# Altium footprint library Package_SO.PcbLib: 333 footprints (part 4 of 21)
Each footprint in its own frame and in the unit in brackets; x right, y up, seen from the top. Pads: shape width x height; smd on the part's side, far side on the other; paste and mask are expansions set on the pad; w line width, h text height; cw(c..) or ccw(c..) is an arc to the next point about the centre after c.
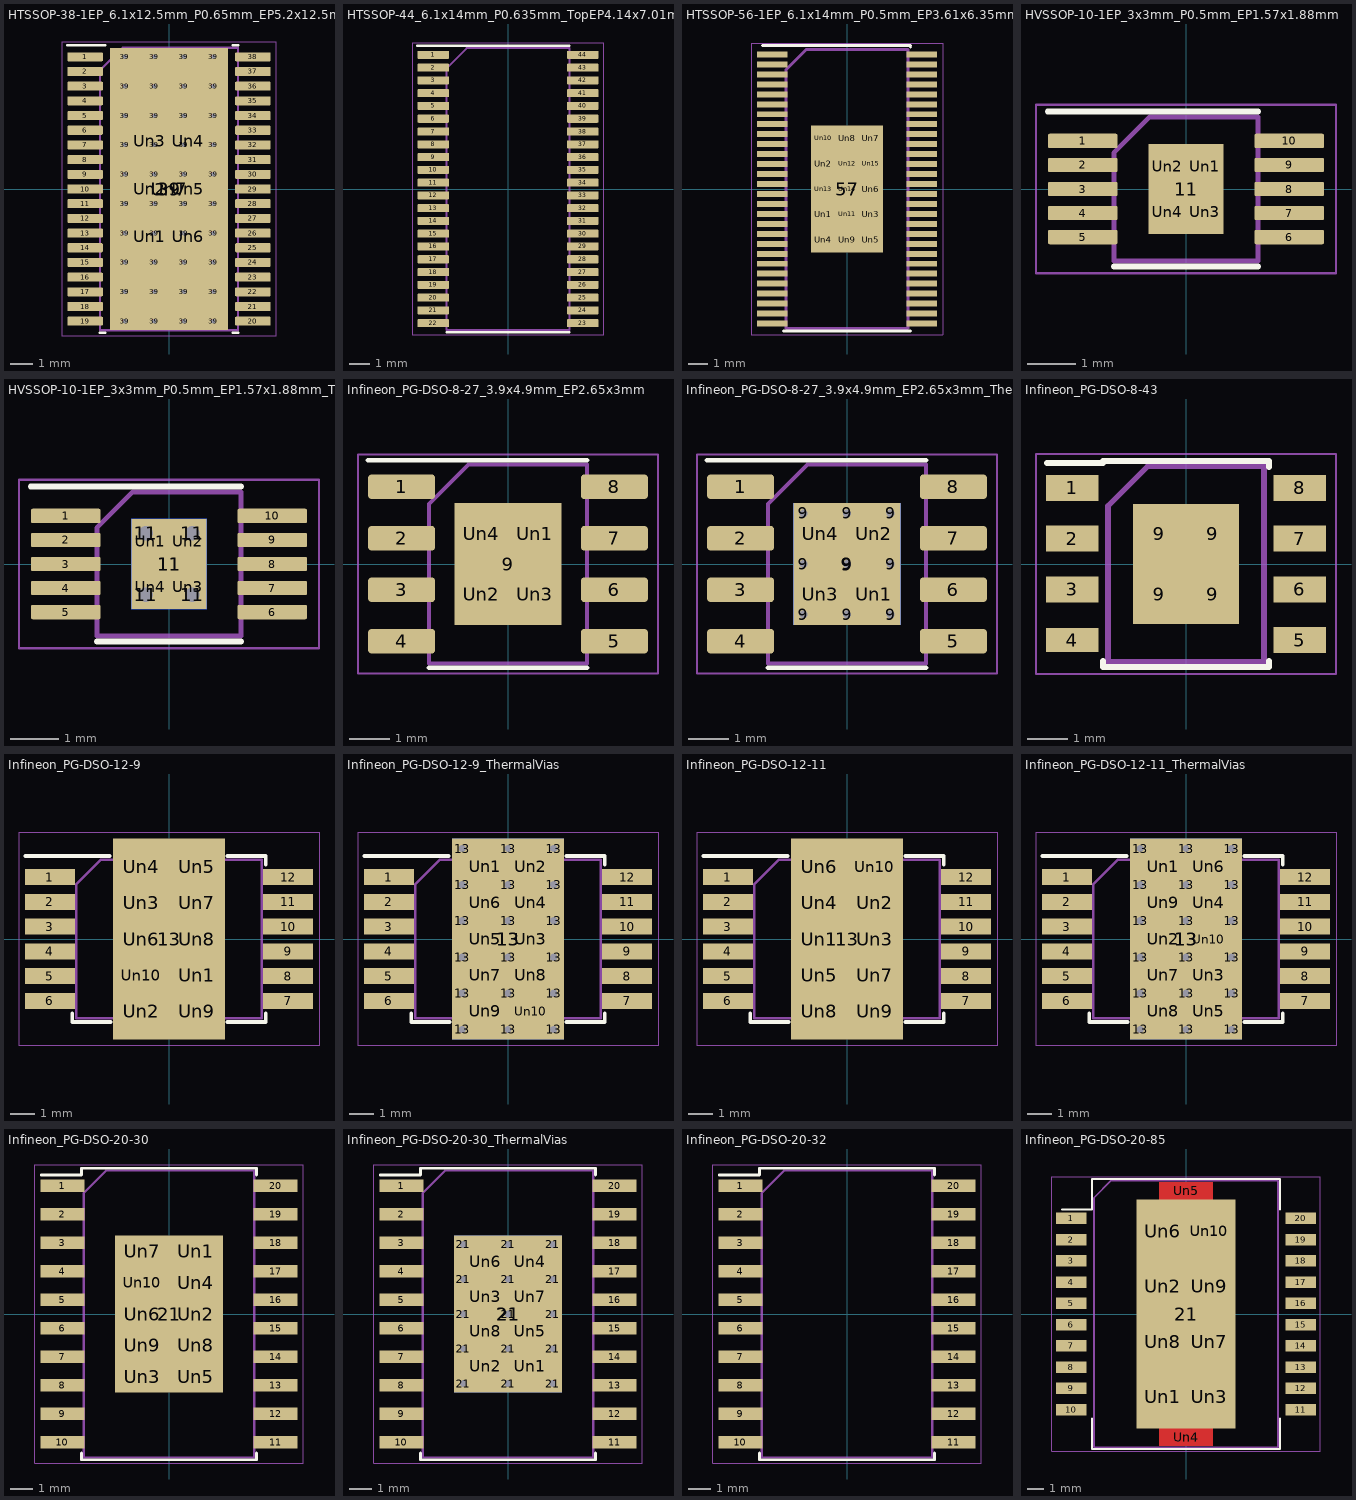
[diagram p3: the footprints below, top view; thin cyan lines are the x and y axes]

## HTSSOP-38-1EP_6.1x12.5mm_P0.65mm_EP5.2x12.5mm_Mask3.39x6.35mm_ThermalVias [mm]
pads (87):
  rrect25% 1.575x0.4 smd: 1(-3.712,5.85) 2(-3.712,5.2) 3(-3.712,4.55) 4(-3.712,3.9) 5(-3.712,3.25) 6(-3.712,2.6) 7(-3.712,1.95) 8(-3.712,1.3) 9(-3.712,0.65) 10(-3.712,0) 11(-3.712,-0.65) 12(-3.712,-1.3) 13(-3.712,-1.95) 14(-3.712,-2.6) 15(-3.712,-3.25) 16(-3.712,-3.9) 17(-3.712,-4.55) 18(-3.712,-5.2) 19(-3.712,-5.85) 20(3.712,-5.85) 21(3.712,-5.2) 22(3.712,-4.55) 23(3.712,-3.9) 24(3.712,-3.25) 25(3.712,-2.6) 26(3.712,-1.95) 27(3.712,-1.3) 28(3.712,-0.65) 29(3.712,0) 30(3.712,0.65) 31(3.712,1.3) 32(3.712,1.95) 33(3.712,2.6) 34(3.712,3.25) 35(3.712,3.9) 36(3.712,4.55) 37(3.712,5.2) 38(3.712,5.85)
  round 0.5 hole 0.2: 39(-1.95,-5.85) 39(-1.95,-4.55) 39(-1.95,-3.25) 39(-1.95,-1.95) 39(-1.95,-0.65) 39(-1.95,0.65) 39(-1.95,1.95) 39(-1.95,3.25) 39(-1.95,4.55) 39(-1.95,5.85) 39(-0.65,-5.85) 39(-0.65,-4.55) 39(-0.65,-3.25) 39(-0.65,-1.95) 39(-0.65,-0.65) 39(-0.65,0.65) 39(-0.65,1.95) 39(-0.65,3.25) 39(-0.65,4.55) 39(-0.65,5.85) 39(0.65,-5.85) 39(0.65,-4.55) 39(0.65,-3.25) 39(0.65,-1.95) 39(0.65,-0.65) 39(0.65,0.65) 39(0.65,1.95) 39(0.65,3.25) 39(0.65,4.55) 39(0.65,5.85) 39(1.95,-5.85) 39(1.95,-4.55) 39(1.95,-3.25) 39(1.95,-1.95) 39(1.95,-0.65) 39(1.95,0.65) 39(1.95,1.95) 39(1.95,3.25) 39(1.95,4.55) 39(1.95,5.85)
  rect 5.2x12.5 smd: 39(0,0)
  rect 4.4x12.2 smd far side: 39(0,0)
  rrect18% 1.37x1.71 on Top Paste: Un1(-0.85,-2.12) Un2(-0.85,0) Un3(-0.85,2.12) Un4(0.85,2.12) Un5(0.85,0) Un6(0.85,-2.12)
  rect 3.39x6.35 on Top Solder: Un7(0,0)
F.SilkS:
  lines w0.12: -4.5,6.36 -2.836,6.36 ; -3.05,-6.36 -2.836,-6.36 ; 2.836,-6.36 3.05,-6.36 ; 2.836,6.36 3.05,6.36
F.CrtYd:
  lines w0.05: -4.75,-6.5 -4.75,6.5 4.75,6.5 4.75,-6.5 -4.75,-6.5
F.Fab:
  lines w0.1: -3.05,-6.25 3.05,-6.25 3.05,6.25 -2.05,6.25 -3.05,5.25 -3.05,-6.25
  text "'.Designator'" at -4.047,-0.84 h1

## HTSSOP-44_6.1x14mm_P0.635mm_TopEP4.14x7.01mm [mm]
pads (44):
  rrect25% 1.575x0.4 smd: 1(-3.712,6.667) 2(-3.712,6.032) 3(-3.712,5.397) 4(-3.712,4.763) 5(-3.712,4.127) 6(-3.712,3.492) 7(-3.712,2.857) 8(-3.712,2.222) 9(-3.712,1.587) 10(-3.712,0.953) 11(-3.712,0.318) 12(-3.712,-0.318) 13(-3.712,-0.953) 14(-3.712,-1.587) 15(-3.712,-2.222) 16(-3.712,-2.857) 17(-3.712,-3.492) 18(-3.712,-4.127) 19(-3.712,-4.763) 20(-3.712,-5.397) 21(-3.712,-6.032) 22(-3.712,-6.667) 23(3.712,-6.667) 24(3.712,-6.032) 25(3.712,-5.397) 26(3.712,-4.763) 27(3.712,-4.127) 28(3.712,-3.492) 29(3.712,-2.857) 30(3.712,-2.222) 31(3.712,-1.587) 32(3.712,-0.953) 33(3.712,-0.318) 34(3.712,0.318) 35(3.712,0.953) 36(3.712,1.587) 37(3.712,2.222) 38(3.712,2.857) 39(3.712,3.492) 40(3.712,4.127) 41(3.712,4.763) 42(3.712,5.397) 43(3.712,6.032) 44(3.712,6.667)
F.SilkS:
  lines w0.12: -4.5,7.127 0,7.127 3.05,7.127 ; -3.05,-7.127 0,-7.127 3.05,-7.127
F.CrtYd:
  lines w0.05: -4.75,-7.25 -4.75,7.25 4.75,7.25 4.75,-7.25 -4.75,-7.25
F.Fab:
  lines w0.1: -3.05,-7 -3.05,6 -2.05,7 3.05,7 3.05,-7 -3.05,-7
  text "'.Designator'" at -4.047,-0.84 h1

## HTSSOP-56-1EP_6.1x14mm_P0.5mm_EP3.61x6.35mm [mm]
pads (72):
  rect 1.55x0.3 smd: 1(-3.75,6.75) 2(-3.75,6.25) 3(-3.75,5.75) 4(-3.75,5.25) 5(-3.75,4.75) 6(-3.75,4.25) 7(-3.75,3.75) 8(-3.75,3.25) 9(-3.75,2.75) 10(-3.75,2.25) 11(-3.75,1.75) 12(-3.75,1.25) 13(-3.75,0.75) 14(-3.75,0.25) 15(-3.75,-0.25) 16(-3.75,-0.75) 17(-3.75,-1.25) 18(-3.75,-1.75) 19(-3.75,-2.25) 20(-3.75,-2.75) 21(-3.75,-3.25) 22(-3.75,-3.75) 23(-3.75,-4.25) 24(-3.75,-4.75) 25(-3.75,-5.25) 26(-3.75,-5.75) 27(-3.75,-6.25) 28(-3.75,-6.75) 29(3.75,-6.75) 30(3.75,-6.25) 31(3.75,-5.75) 32(3.75,-5.25) 33(3.75,-4.75) 34(3.75,-4.25) 35(3.75,-3.75) 36(3.75,-3.25) 37(3.75,-2.75) 38(3.75,-2.25) 39(3.75,-1.75) 40(3.75,-1.25) 41(3.75,-0.75) 42(3.75,-0.25) 43(3.75,0.25) 44(3.75,0.75) 45(3.75,1.25) 46(3.75,1.75) 47(3.75,2.25) 48(3.75,2.75) 49(3.75,3.25) 50(3.75,3.75) 51(3.75,4.25) 52(3.75,4.75) 53(3.75,5.25) 54(3.75,5.75) 55(3.75,6.25) 56(3.75,6.75)
  rect 3.61x6.35 smd: 57(0,0)
  rect 0.96x1.03 on Top Paste: Un1(-1.203,-1.27) Un2(-1.203,1.27) Un3(1.203,-1.27) Un4(-1.203,-2.54) Un5(1.203,-2.54) Un6(1.203,0) Un7(1.203,2.54) Un8(0,2.54) Un9(0,-2.54) Un10(-1.203,2.54) Un11(0,-1.27) Un12(0,1.27) Un13(-1.203,0) Un14(0,0) Un15(1.203,1.27)
F.SilkS:
  lines w0.15: -4.25,7.2 3.175,7.2 ; -3.175,-7.117 -3.175,-7.125 3.175,-7.125 3.175,-7.117 ; 3.175,7.117 3.175,7.125
F.CrtYd:
  lines w0.05: -4.8,-7.3 4.8,-7.3 4.8,7.3 -4.8,7.3 -4.8,-7.3
F.Fab:
  lines w0.15: -3.05,-7 -3.05,6 -2.05,7 3.05,7 3.05,-7 -3.05,-7
  text "'.Designator'" at -4.047,-0.84 h1

## HVSSOP-10-1EP_3x3mm_P0.5mm_EP1.57x1.88mm [mm]
pads (15):
  rrect25% 1.45x0.3 smd: 1(-2.15,1) 2(-2.15,0.5) 3(-2.15,0) 4(-2.15,-0.5) 5(-2.15,-1) 6(2.15,-1) 7(2.15,-0.5) 8(2.15,0) 9(2.15,0.5) 10(2.15,1)
  rect 1.57x1.88 smd: 11(0,0)
  rrect25% 0.63x0.76 on Top Paste: Un1(0.39,0.47) Un2(-0.39,0.47) Un3(0.39,-0.47) Un4(-0.39,-0.47)
F.SilkS:
  lines w0.12: -2.875,1.61 0,1.61 1.5,1.61 ; -1.5,-1.61 0,-1.61 1.5,-1.61
F.CrtYd:
  lines w0.05: -3.12,-1.75 -3.12,1.75 3.12,1.75 3.12,-1.75 -3.12,-1.75
F.Fab:
  lines w0.1: -1.5,-1.5 -1.5,0.75 -0.75,1.5 1.5,1.5 1.5,-1.5 -1.5,-1.5
  text "'.Designator'" at -3.033,-0.628 h0.75

## HVSSOP-10-1EP_3x3mm_P0.5mm_EP1.57x1.88mm_ThermalVias [mm]
pads (20):
  rrect25% 1.45x0.3 smd: 1(-2.15,1) 2(-2.15,0.5) 3(-2.15,0) 4(-2.15,-0.5) 5(-2.15,-1) 6(2.15,-1) 7(2.15,-0.5) 8(2.15,0) 9(2.15,0.5) 10(2.15,1)
  round 0.6 hole 0.3: 11(-0.485,-0.64) 11(-0.485,0.64) 11(0.485,-0.64) 11(0.485,0.64)
  rect 1.57x1.88 smd: 11(0,0)
  rect 1.57x1.88 smd far side: 11(0,0)
  rrect25% 0.63x0.76 on Top Paste: Un1(-0.39,0.47) Un2(0.39,0.47) Un3(0.39,-0.47) Un4(-0.39,-0.47)
F.SilkS:
  lines w0.12: -2.875,1.61 0,1.61 1.5,1.61 ; -1.5,-1.61 0,-1.61 1.5,-1.61
F.CrtYd:
  lines w0.05: -3.12,-1.75 3.12,-1.75 3.12,1.75 -3.12,1.75 -3.12,-1.75
F.Fab:
  lines w0.1: -1.5,-1.5 1.5,-1.5 1.5,1.5 -0.75,1.5 -1.5,0.75 -1.5,-1.5
  text "'.Designator'" at -3.033,-0.628 h0.75

## Infineon_PG-DSO-8-27_3.9x4.9mm_EP2.65x3mm [mm]
pads (13):
  rrect25% 1.65x0.6 smd: 1(-2.625,1.905) 2(-2.625,0.635) 3(-2.625,-0.635) 4(-2.625,-1.905) 5(2.625,-1.905) 6(2.625,-0.635) 7(2.625,0.635) 8(2.625,1.905)
  rect 2.65x3 smd: 9(0,0)
  rrect23% 1.07x1.21 on Top Paste: Un1(0.66,0.75) Un2(-0.66,-0.75) Un3(0.66,-0.75) Un4(-0.66,0.75)
F.SilkS:
  lines w0.12: -3.45,2.56 0,2.56 1.95,2.56 ; -1.95,-2.56 0,-2.56 1.95,-2.56
F.CrtYd:
  lines w0.05: -3.7,-2.7 -3.7,2.7 3.7,2.7 3.7,-2.7 -3.7,-2.7
F.Fab:
  lines w0.1: -1.95,-2.45 -1.95,1.475 -0.975,2.45 1.95,2.45 1.95,-2.45 -1.95,-2.45
  text "'.Designator'" at -3.969,-0.827 h0.98

## Infineon_PG-DSO-8-27_3.9x4.9mm_EP2.65x3mm_ThermalVias [mm]
pads (23):
  rrect25% 1.65x0.6 smd: 1(-2.625,1.905) 2(-2.625,0.635) 3(-2.625,-0.635) 4(-2.625,-1.905) 5(2.625,-1.905) 6(2.625,-0.635) 7(2.625,0.635) 8(2.625,1.905)
  round 0.5 hole 0.2: 9(-1.075,-1.25) 9(-1.075,0) 9(-1.075,1.25) 9(0,-1.25) 9(0,0) 9(0,1.25) 9(1.075,-1.25) 9(1.075,0) 9(1.075,1.25)
  rect 2.65x3 smd: 9(0,0)
  rect 2.65x3 smd far side: 9(0,0)
  rrect23% 1.11x1.25 on Top Paste: Un1(0.66,-0.75) Un2(0.66,0.75) Un3(-0.66,-0.75) Un4(-0.66,0.75)
F.SilkS:
  lines w0.12: -3.45,2.56 0,2.56 1.95,2.56 ; -1.95,-2.56 0,-2.56 1.95,-2.56
F.CrtYd:
  lines w0.05: -3.7,-2.7 -3.7,2.7 3.7,2.7 3.7,-2.7 -3.7,-2.7
F.Fab:
  lines w0.1: -1.95,-2.45 -1.95,1.475 -0.975,2.45 1.95,2.45 1.95,-2.45 -1.95,-2.45
  text "'.Designator'" at -3.969,-0.827 h0.98

## Infineon_PG-DSO-8-43 [mm]
pads (12):
  rect 1.31x0.65 smd: 1(-2.845,1.905) 2(-2.845,0.635) 3(-2.845,-0.635) 5(2.845,-1.905) 6(2.845,-0.635) 7(2.845,0.635) 8(2.845,1.905)
  rect 1.31x0.6 smd: 4(-2.845,-1.905)
  rect 1.325x1.5 smd: 9(-0.663,-0.75) 9(-0.663,0.75) 9(0.663,-0.75) 9(0.663,0.75)
F.SilkS:
  lines w0.15: -3.475,2.525 -2.075,2.525 -2.075,2.575 2.075,2.575 2.075,2.43 ; -2.075,-2.43 -2.075,-2.575 2.075,-2.575 2.075,-2.43
F.CrtYd:
  lines w0.05: -3.75,-2.75 -3.75,2.75 3.75,2.75 3.75,-2.75 -3.75,-2.75
F.Fab:
  lines w0.15: -1.95,-2.45 -1.95,1.45 -0.95,2.45 1.95,2.45 1.95,-2.45 -1.95,-2.45
  text "'.Designator'" at -3.642,-0.756 h0.9

## Infineon_PG-DSO-12-9 [mm]
pads (23):
  rect 2x0.65 smd: 1(-4.8,2.5) 2(-4.8,1.5) 3(-4.8,0.5) 4(-4.8,-0.5) 5(-4.8,-1.5) 6(-4.8,-2.5) 7(4.8,-2.5) 8(4.8,-1.5) 9(4.8,-0.5) 10(4.8,0.5) 11(4.8,1.5) 12(4.8,2.5)
  rect 4.5x8.1 smd: 13(0,0)
  rect 1.95x1.16 on Top Paste: Un1(1.125,-1.46) Un2(-1.125,-2.92) Un3(-1.125,1.46) Un4(-1.125,2.92) Un5(1.125,2.92) Un6(-1.125,0) Un7(1.125,1.46) Un8(1.125,0) Un9(1.125,-2.92) Un10(-1.125,-1.46)
F.SilkS:
  lines w0.15: -5.8,3.35 -2.4,3.35 ; -3.9,-3 -3.9,-3.35 -2.35,-3.35 ; 2.35,-3.35 3.9,-3.35 3.9,-3 ; 2.35,3.35 3.9,3.35 3.9,3
F.CrtYd:
  lines w0.05: -6.05,-4.3 -6.05,4.3 6.05,4.3 6.05,-4.3 -6.05,-4.3
F.Fab:
  lines w0.1: -3.75,-3.2 -3.75,2.2 -2.75,3.2 -0.9,3.2 -0.9,3.9 0.9,3.9 0.9,3.2 3.75,3.2 3.75,-3.2 0.9,-3.2 0.9,-3.9 -0.9,-3.9 -0.9,-3.2 -3.75,-3.2
  text "'.Designator'" at -4.047,-0.84 h1

## Infineon_PG-DSO-12-9_ThermalVias [mm]
pads (42):
  rect 2x0.65 smd: 1(-4.8,2.5) 2(-4.8,1.5) 3(-4.8,0.5) 4(-4.8,-0.5) 5(-4.8,-1.5) 6(-4.8,-2.5) 7(4.8,-2.5) 8(4.8,-1.5) 9(4.8,-0.5) 10(4.8,0.5) 11(4.8,1.5) 12(4.8,2.5)
  round 0.8 hole 0.3: 13(-1.85,-3.65) 13(-1.85,-2.19) 13(-1.85,-0.73) 13(-1.85,0.73) 13(-1.85,2.19) 13(-1.85,3.65) 13(0,-3.65) 13(0,-2.19) 13(0,-0.73) 13(0,0.73) 13(0,2.19) 13(0,3.65) 13(1.85,-3.65) 13(1.85,-2.19) 13(1.85,-0.73) 13(1.85,0.73) 13(1.85,2.19) 13(1.85,3.65)
  rect 4.5x8.1 smd: 13(0,0)
  rect 4.5x8.1 smd far side: 13(0,0)
  rect 1.55x1.16 on Top Paste: Un1(-0.925,2.92) Un2(0.925,2.92) Un3(0.925,0) Un4(0.925,1.46) Un5(-0.925,0) Un6(-0.925,1.46) Un7(-0.925,-1.46) Un8(0.925,-1.46) Un9(-0.925,-2.92) Un10(0.925,-2.92)
F.SilkS:
  lines w0.15: -5.8,3.35 -2.4,3.35 ; -3.9,-3 -3.9,-3.35 -2.35,-3.35 ; 2.35,-3.35 3.9,-3.35 3.9,-3 ; 2.35,3.35 3.9,3.35 3.9,3
F.CrtYd:
  lines w0.05: -6.05,-4.3 -6.05,4.3 6.05,4.3 6.05,-4.3 -6.05,-4.3
F.Fab:
  lines w0.1: -3.75,-3.2 -0.9,-3.2 -0.9,-3.9 0.9,-3.9 0.9,-3.2 3.75,-3.2 3.75,3.2 0.9,3.2 0.9,3.9 -0.9,3.9 -0.9,3.2 -2.75,3.2 -3.75,2.2 -3.75,-3.2
  text "'.Designator'" at -4.047,-0.84 h1

## Infineon_PG-DSO-12-11 [mm]
pads (23):
  rect 2x0.65 smd: 1(-4.8,2.5) 2(-4.8,1.5) 3(-4.8,0.5) 4(-4.8,-0.5) 5(-4.8,-1.5) 6(-4.8,-2.5) 7(4.8,-2.5) 8(4.8,-1.5) 9(4.8,-0.5) 10(4.8,0.5) 11(4.8,1.5) 12(4.8,2.5)
  rect 4.5x8.1 smd: 13(0,0)
  rect 1.95x1.16 on Top Paste: Un1(-1.125,0) Un2(1.125,1.46) Un3(1.125,0) Un4(-1.125,1.46) Un5(-1.125,-1.46) Un6(-1.125,2.92) Un7(1.125,-1.46) Un8(-1.125,-2.92) Un9(1.125,-2.92) Un10(1.125,2.92)
F.SilkS:
  lines w0.15: -5.8,3.35 -2.4,3.35 ; -3.9,-3 -3.9,-3.35 -2.35,-3.35 ; 2.35,-3.35 3.9,-3.35 3.9,-3 ; 2.35,3.35 3.9,3.35 3.9,3
F.CrtYd:
  lines w0.05: -6.05,-4.3 6.05,-4.3 6.05,4.3 -6.05,4.3 -6.05,-4.3
F.Fab:
  lines w0.1: -3.75,-3.2 -3.75,2.2 -2.75,3.2 -0.9,3.2 -0.9,3.9 0.9,3.9 0.9,3.2 3.75,3.2 3.75,-3.2 0.9,-3.2 0.9,-3.9 -0.9,-3.9 -0.9,-3.2 -3.75,-3.2
  text "'.Designator'" at -4.047,-0.84 h1

## Infineon_PG-DSO-12-11_ThermalVias [mm]
pads (42):
  rect 2x0.65 smd: 1(-4.8,2.5) 2(-4.8,1.5) 3(-4.8,0.5) 4(-4.8,-0.5) 5(-4.8,-1.5) 6(-4.8,-2.5) 7(4.8,-2.5) 8(4.8,-1.5) 9(4.8,-0.5) 10(4.8,0.5) 11(4.8,1.5) 12(4.8,2.5)
  round 0.8 hole 0.3: 13(-1.85,-3.65) 13(-1.85,-2.19) 13(-1.85,-0.73) 13(-1.85,0.73) 13(-1.85,2.19) 13(-1.85,3.65) 13(0,-3.65) 13(0,-2.19) 13(0,-0.73) 13(0,0.73) 13(0,2.19) 13(0,3.65) 13(1.85,-3.65) 13(1.85,-2.19) 13(1.85,-0.73) 13(1.85,0.73) 13(1.85,2.19) 13(1.85,3.65)
  rect 4.5x8.1 smd: 13(0,0)
  rect 4.5x8.1 smd far side: 13(0,0)
  rect 1.55x1.16 on Top Paste: Un1(-0.925,2.92) Un2(-0.925,0) Un3(0.925,-1.46) Un4(0.925,1.46) Un5(0.925,-2.92) Un6(0.925,2.92) Un7(-0.925,-1.46) Un8(-0.925,-2.92) Un9(-0.925,1.46) Un10(0.925,0)
F.SilkS:
  lines w0.15: -5.8,3.35 -2.4,3.35 ; -3.9,-3 -3.9,-3.35 -2.35,-3.35 ; 2.35,-3.35 3.9,-3.35 3.9,-3 ; 2.35,3.35 3.9,3.35 3.9,3
F.CrtYd:
  lines w0.05: -6.05,-4.3 -6.05,4.3 6.05,4.3 6.05,-4.3 -6.05,-4.3
F.Fab:
  lines w0.1: -3.75,-3.2 -0.9,-3.2 -0.9,-3.9 0.9,-3.9 0.9,-3.2 3.75,-3.2 3.75,3.2 0.9,3.2 0.9,3.9 -0.9,3.9 -0.9,3.2 -2.75,3.2 -3.75,2.2 -3.75,-3.2
  text "'.Designator'" at -4.047,-0.84 h1

## Infineon_PG-DSO-20-30 [mm]
pads (31):
  rect 1.95x0.55 smd: 1(-4.75,5.715) 2(-4.75,4.445) 3(-4.75,3.175) 4(-4.75,1.905) 5(-4.75,0.635) 6(-4.75,-0.635) 7(-4.75,-1.905) 8(-4.75,-3.175) 9(-4.75,-4.445) 10(-4.75,-5.715) 11(4.75,-5.715) 12(4.75,-4.445) 13(4.75,-3.175) 14(4.75,-1.905) 15(4.75,-0.635) 16(4.75,0.635) 17(4.75,1.905) 18(4.75,3.175) 19(4.75,4.445) 20(4.75,5.715)
  rect 4.8x7 smd: 21(0,0)
  rect 2.1x1.1 on Top Paste: Un1(1.2,2.8) Un2(1.2,0) Un3(-1.2,-2.8) Un4(1.2,1.4) Un5(1.2,-2.8) Un6(-1.2,0) Un7(-1.2,2.8) Un8(1.2,-1.4) Un9(-1.2,-1.4) Un10(-1.2,1.4)
F.SilkS:
  lines w0.12: -5.7,6.2 -3.9,6.2 -3.9,6.5 3.9,6.5 3.9,6.2 ; -3.9,-6.2 -3.9,-6.5 3.9,-6.5 3.9,-6.2
F.CrtYd:
  lines w0.05: -5.98,-6.65 5.98,-6.65 5.98,6.65 -5.98,6.65 -5.98,-6.65
F.Fab:
  lines w0.1: -3.8,-6.4 3.8,-6.4 3.8,6.4 -2.8,6.4 -3.8,5.4 -3.8,-6.4
  text "'.Designator'" at -4.047,-0.84 h1

## Infineon_PG-DSO-20-30_ThermalVias [mm]
pads (45):
  rect 1.95x0.55 smd: 1(-4.75,5.715) 2(-4.75,4.445) 3(-4.75,3.175) 4(-4.75,1.905) 5(-4.75,0.635) 6(-4.75,-0.635) 7(-4.75,-1.905) 8(-4.75,-3.175) 9(-4.75,-4.445) 10(-4.75,-5.715) 11(4.75,-5.715) 12(4.75,-4.445) 13(4.75,-3.175) 14(4.75,-1.905) 15(4.75,-0.635) 16(4.75,0.635) 17(4.75,1.905) 18(4.75,3.175) 19(4.75,4.445) 20(4.75,5.715)
  round 0.8 hole 0.3: 21(-2,-3.1) 21(-2,-1.55) 21(-2,0) 21(-2,1.55) 21(-2,3.1) 21(0,-3.1) 21(0,-1.55) 21(0,0) 21(0,1.55) 21(0,3.1) 21(2,-3.1) 21(2,-1.55) 21(2,0) 21(2,1.55) 21(2,3.1)
  rect 4.8x7 smd far side: 21(0,0)
  rect 4.8x7 smd: 21(0,0)
  rect 1.7x1.25 on Top Paste: Un1(1,-2.325) Un2(-1,-2.325) Un3(-1,0.775) Un4(1,2.325) Un5(1,-0.775) Un6(-1,2.325) Un7(1,0.775) Un8(-1,-0.775)
F.SilkS:
  lines w0.12: -5.7,6.2 -3.9,6.2 -3.9,6.5 3.9,6.5 3.9,6.2 ; -3.9,-6.2 -3.9,-6.5 3.9,-6.5 3.9,-6.2
F.CrtYd:
  lines w0.05: -5.98,-6.65 -5.98,6.65 5.98,6.65 5.98,-6.65 -5.98,-6.65
F.Fab:
  lines w0.1: -3.8,-6.4 3.8,-6.4 3.8,6.4 -2.8,6.4 -3.8,5.4 -3.8,-6.4
  text "'.Designator'" at -4.047,-0.84 h1

## Infineon_PG-DSO-20-32 [mm]
pads (20):
  rect 1.95x0.55 smd: 1(-4.75,5.715) 2(-4.75,4.445) 3(-4.75,3.175) 4(-4.75,1.905) 5(-4.75,0.635) 6(-4.75,-0.635) 7(-4.75,-1.905) 8(-4.75,-3.175) 9(-4.75,-4.445) 10(-4.75,-5.715) 11(4.75,-5.715) 12(4.75,-4.445) 13(4.75,-3.175) 14(4.75,-1.905) 15(4.75,-0.635) 16(4.75,0.635) 17(4.75,1.905) 18(4.75,3.175) 19(4.75,4.445) 20(4.75,5.715)
F.SilkS:
  lines w0.12: -5.7,6.2 -3.9,6.2 -3.9,6.5 3.9,6.5 3.9,6.2 ; -3.9,-6.2 -3.9,-6.5 3.9,-6.5 3.9,-6.2
F.CrtYd:
  lines w0.05: -5.98,-6.65 -5.98,6.65 5.98,6.65 5.98,-6.65 -5.98,-6.65
F.Fab:
  lines w0.1: -3.8,-6.4 3.8,-6.4 3.8,6.4 -2.8,6.4 -3.8,5.4 -3.8,-6.4
  text "'.Designator'" at 0.84,-4.047 h1

## Infineon_PG-DSO-20-85 [mm]
pads (31):
  rect 1.83x0.68 smd: 1(-6.865,5.715) 2(-6.865,4.445) 3(-6.865,3.175) 4(-6.865,1.905) 5(-6.865,0.635) 6(-6.865,-0.635) 7(-6.865,-1.905) 8(-6.865,-3.175) 9(-6.865,-4.445) 10(-6.865,-5.715) 11(6.865,-5.715) 12(6.865,-4.445) 13(6.865,-3.175) 14(6.865,-1.905) 15(6.865,-0.635) 16(6.865,0.635) 17(6.865,1.905) 18(6.865,3.175) 19(6.865,4.445) 20(6.865,5.715)
  rect 5.9x13.7 smd: 21(0,0)
  rect 2.4x2.8 on Top Paste: Un1(-1.4,-4.95) Un2(-1.4,1.65) Un3(1.4,-4.95) Un6(-1.4,4.95) Un7(1.4,-1.65) Un8(-1.4,-1.65) Un9(1.4,1.65) Un10(1.4,4.95)
  rect 3.2x1 on Top Paste: Un4(0,-7.36) Un5(0,7.36)
F.Cu:
  region: 1.6,-7.87 -1.6,-7.87 -1.6,7.87 1.6,7.87
F.SilkS:
  lines w0.12: -7.4,6.235 -5.61,6.235 -5.61,8.06 5.61,8.06 5.61,6.235 ; -5.61,-6.235 -5.61,-8.06 5.61,-8.06 5.61,-6.235
F.Mask:
  region: 1.6,-7.87 -1.6,-7.87 -1.6,7.87 1.6,7.87
F.CrtYd:
  lines w0.05: -8.03,-8.2 8.03,-8.2 8.03,8.2 -8.03,8.2 -8.03,-8.2
F.Fab:
  lines w0.1: -5.5,-7.95 -5.5,6.95 -4.5,7.95 5.5,7.95 5.5,-7.95 -5.5,-7.95
  text "'.Designator'" at -4.047,-0.84 h1